# Altium schematic symbol library lib_datalogger.SchLib: 1246 symbols (part 9 of 16) (continued)
## CMP-011-000019-1 (continued)
HF INDUCTORS 33NH ±5% 300MA 0603 ROHS; Manufacturer Part Number: SDCL1608C33NJTDF; Source: mits.SchLib; Stock 1: 126950; Pricing 1: 50=0,02300, 500=0,01710, 1500=0,01610, 5000=0,01120, 25000=0,01090, 50000=0,01070, 50=0,02220, 500=0,01650, 1500=0,01550, 5000=0,01080, 25000=0,01050, 50000=0,01030, 50=0,11560, 500=0,08610, 1500=0,08080, 5000=0,05650, 25000=0,05450, 50000=0,05390, 50=0,11120, 500=0,08270, 1500=0,07770, 5000=0,05430, 25000=0,05240, 50000=0,05180, 50=0,01490, 500=0,01110, 1500=0,01040, 5000=0,00730, 25000=0,00700, 50000=0,00700, 50=0,01280, 500=0,00950, 1500=0,00890, 5000=0,00620, 25000=0,00600, 50000=0,00600, 50=0,13680, 500=0,10180, 1500=0,09560, 5000=0,06690, 25000=0,06450, 50000=0,06370, 50=1,93360, 500=1,43920, 1500=1,35130, 5000=0,94480, 25000=0,91190, 50000=0,90090, 50=0,07290, 500=0,05430, 1500=0,05100, 5000=0,03560, 25000=0,03440, 50000=0,03400, 50=1,33140, 500=0,99100, 1500=0,93050, 5000=0,65060, 25000=0,62790, 50000=0,62030, 50=0,15280, 500=0,11380, 1500=0,10680, 5000=0,07470, 25000=0,07210, 50000=0,07120, 50=0,02370, 500=0,01770, 1500=0,01660, 5000=0,01160, 25000=0,01120, 50000=0,01110, 50=0,01760, 500=0,01310, 1500=0,01230, 5000=0,00860, 25000=0,00830, 50000=0,00820 (AUD); Design Item ID: FIXED IND 33NH 300MA 800 MOHM 0603 SMD
footprint IND 6.6MM_7.1MM
footprint CI1608-0603 (Chip Inductor; Body 1.6 x 0.8 mm (LxW typ))
pins: 1, 2

## CMP-011-000020-1
designator L?, comment FIXED IND 470UH 50MA 22OHM 2518 SMD  Lead Pitch: 1.5mm  Shielding: Unshielded  Self Resonant Frequency: 3.5MHz  Packaging: Tape and Reel  Inductance: 470uH  Package Quantity: 2000  Core Material: Ferrite  Max Operating Temperature: 105°C  Current Rating: 50mA  Min Operating Temperature: -25°C  Manufacturer: Taiyo Yuden  Case/Package: 1007  RoHS Compliant: Yes  Tolerance: 10%
FIXED IND 470UH 50MA 22 OHM SMD; Manufacturer Part Number: LBC2518T471K; DC Resistance (DCR): 22R; Test Frequency: 796kHz; Height - Seated (Max): 0.079inch; Lead Free: Lead Free; ComponentLink1Description: https://datasheet.ciiva.com/8502/lbc2518t471k-ss-8502960.pdf?src-supplier=Avnet; DC Current: 50mA; Width: 0.071inch; Resistor Type: Wirewound; Pricing 1: 5=0,12170, 50=0,09320, 150=0,08810, 500=0,08290, 2500=0,08050, 5000=0,07940, 5=0,11660, 50=0,08930, 150=0,08440, 500=0,07940, 2500=0,07720, 5000=0,07600, 5=0,61140, 50=0,46820, 150=0,44260, 500=0,41630, 2500=0,40450, 5000=0,39860, 5=0,58640, 50=0,44910, 150=0,42450, 500=0,39930, 2500=0,38800, 5000=0,38230, 5=0,07880, 50=0,06040, 150=0,05710, 500=0,05370, 2500=0,05220, 5000=0,05140, 5=0,06700, 50=0,05130, 150=0,04850, 500=0,04560, 2500=0,04430, 5000=0,04370, 5=0,72390, 50=0,55440, 150=0,52410, 500=0,49300, 2500=0,47900, 5000=0,47200, 5=10,26330, 50=7,86000, 150=7,43010, 500=6,98920, 2500=6,79070, 5000=6,69150, 5=0,38510, 50=0,29490, 150=0,27880, 500=0,26220, 2500=0,25480, 5000=0,25110, 5=7,12640, 50=5,45770, 150=5,15920, 500=4,85300, 2500=4,71520, 5000=4,64630, 5=0,81080, 50=0,62090, 150=0,58700, 500=0,55210, 2500=0,53650, 5000=0,52860, 5=0,12490, 50=0,09560, 150=0,09040, 500=0,08500, 2500=0,08260, 5000=0,08140, 5=0,09310, 50=0,07130, 150=0,06740, 500=0,06340, 2500=0,06160, 5000=0,06070 (AUD); Case Code (Metric): 2518; Case Code (Imperial): 1007; Length: 0.098inch; Termination: SMD/SMT; ComponentLink3URL: https://datasheet.ciiva.com/26872/getdatasheetpartid-638686-26872344.pdf?src-supplier=Verical; ComponentLink2URL: https://datasheet.ciiva.com/1064/lbc2518t471k-ss-1064311.pdf?src-supplier=Digi-Key; Height: 2mm; Series: LB; Design Item ID: FIXED IND 470UH 50MA 22OHM 2518 SMD; Max DC Current: 50mA; Source: mits.SchLib; Category: Fixed Inductors; Radiation Hardening: No; Military Standard: Not; ComponentLink2Description: https://datasheet.ciiva.com/1064/lbc2518t471k-ss-1064311.pdf?src-supplier=Digi-Key; Mount: Surface Mount; Stock 1: 3920; Halogen Free: Halogen Free; RoHS: Yes; ComponentLink3Description: https://datasheet.ciiva.com/26872/getdatasheetpartid-638686-26872344.pdf?src-supplier=Verical; Depth: 2mm; ComponentLink1URL: https://datasheet.ciiva.com/8502/lbc2518t471k-ss-8502960.pdf?src-supplier=Avnet
footprint IND 6.6MM_7.1MM
footprint CI2518
pins: 1, 2

## CMP-011-000021-1
designator L?, comment FIXED IND 47UH 500MA 1.3 MOHM SMD  Inductance: 47uH  Tolerance: 10%  Manufacturer: Murata  Packaging: Tape and Reel  Shielding: Unshielded  Self Resonant Frequency: 15MHz  Core Material: Ferrite  Case/Package: 1210  Current Rating: 170mA  Min Operating Temperature: -40°C  Max Operating Temperature: 85°C  Package Quantity: 2000
FIXED IND 47UH 170MA 1.3 OHM SMD; Manufacturer Part Number: LQH32CN470K23L; Test Frequency: 1MHz; DC Resistance (DCR): 1.3R; Pricing 1: 1=0,33000, 10=0,29700, 100=0,20430, 500=0,17458, 1000=0,13372 (USD); Current: 170mA; Category: Fixed Inductors; ComponentLink2URL: https://datasheet.ciiva.com/5740/1784417-5740928.pdf?src-supplier=Farnell; Height: 2mm; Weight: 0.002116oz; Frequency: 15MHz; ComponentLink12URL: https://datasheet.ciiva.com/1042/l0075s0093lqh32c-2333-1042913.pdf?src-supplier=Digi-Key; ComponentLink7Description: https://datasheet.ciiva.com/1042/l0075s0093lqh32c-2333-1042915.pdf?src-supplier=Digi-Key; Radiation Hardening: No; Height - Seated (Max): 0.067inch; ComponentLink3Description: https://datasheet.ciiva.com/11799/0900766b8121da8f-11799965.pdf?src-supplier=RSComponents; ComponentLink10URL: https://datasheet.ciiva.com/8002/1784417-8002701.pdf?src-supplier=Element14; Lead Free: Lead Free; ComponentLink4Description: https://datasheet.ciiva.com/34302/1864636-34302895.pdf?src-supplier=Jameco; Depth: 2.7mm; Composition: Wirewound; Case Code (Metric): 3225; Width: 2.5mm; Military Standard: Not; Source: mits.SchLib; Inductance Tolerance: 10%; ComponentLink11URL: https://datasheet.ciiva.com/17247/l0075s0093lqh32c-2333-17247822.pdf?src-supplier=Avnet+Europe; ComponentLink6Description: https://datasheet.ciiva.com/1042/l0075s0093lqh32c-2333-1042914.pdf?src-supplier=Digi-Key; ComponentLink13URL: https://datasheet.ciiva.com/16456/l0075s0093lqh32c-2333-16456184.pdf?src-supplier=Future+Electronics; ComponentLink8Description: https://datasheet.ciiva.com/8506/l0075s0093lqh32c-2333-8506550.pdf?src-supplier=Avnet; Case Code (Imperial): 1210; ComponentLink4URL: https://datasheet.ciiva.com/34302/1864636-34302895.pdf?src-supplier=Jameco; Stock 1: 22937; ComponentLink8URL: https://datasheet.ciiva.com/8506/l0075s0093lqh32c-2333-8506550.pdf?src-supplier=Avnet; ComponentLink12Description: https://datasheet.ciiva.com/1042/l0075s0093lqh32c-2333-1042913.pdf?src-supplier=Digi-Key; ComponentLink1URL: https://datasheet.ciiva.com/18088/getdatasheetpartid-55803-18088831.pdf?src-supplier=Verical; ComponentLink7URL: https://datasheet.ciiva.com/1042/l0075s0093lqh32c-2333-1042915.pdf?src-supplier=Digi-Key; DC Current: 170mA; ComponentLink6URL: https://datasheet.ciiva.com/1042/l0075s0093lqh32c-2333-1042914.pdf?src-supplier=Digi-Key; Termination: SMD/SMT; ComponentLink1Description: https://datasheet.ciiva.com/18088/getdatasheetpartid-55803-18088831.pdf?src-supplier=Verical; ComponentLink11Description: https://datasheet.ciiva.com/17247/l0075s0093lqh32c-2333-17247822.pdf?src-supplier=Avnet+Europe; ComponentLink2Description: https://datasheet.ciiva.com/5740/1784417-5740928.pdf?src-supplier=Farnell; ComponentLink3URL: https://datasheet.ciiva.com/11799/0900766b8121da8f-11799965.pdf?src-supplier=RSComponents; ComponentLink10Description: https://datasheet.ciiva.com/8002/1784417-8002701.pdf?src-supplier=Element14; Mount: Surface Mount; ComponentLink13Description: https://datasheet.ciiva.com/16456/l0075s0093lqh32c-2333-16456184.pdf?src-supplier=Future+Electronics; REACH SVHC: No SVHC; ComponentLink5URL: https://datasheet.ciiva.com/29348/536643-da-01-en-induktivitaet-10-47uh-170ma-3-2x2-50-29348773.pdf?src-supplier=Conrad; Max DC Current: 170mA; ComponentLink9Description: https://datasheet.ciiva.com/8002/1784417-8002698.pdf?src-supplier=Element14; Design Item ID: FIXED IND 47UH 500MA 1.3 MOHM SMD; RoHS: Yes; ComponentLink9URL: https://datasheet.ciiva.com/8002/1784417-8002698.pdf?src-supplier=Element14; Length: 3.2mm; ComponentLink5Description: https://datasheet.ciiva.com/29348/536643-da-01-en-induktivitaet-10-47uh-170ma-3-2x2-50-29348773.pdf?src-supplier=Conrad
footprint IND 6.6MM_7.1MM
footprint CI3225
pins: 1, 2

## CMP-011-000022-1
designator L?, comment FIXED IND 5.6nH 800mA  51mOHM 0402 SMD  Case/Package: 0402  Inductance: 5.6nH  Package Quantity: 1  Core Material: Air  Max Operating Temperature: 125°C  RoHS Compliant: Yes  Manufacturer: Murata  Shielding: Unshielded  Current Rating: 800mA  Min Operating Temperature: -55°C  Q Factor: 30  Self Resonant Frequency: 8GHz  Packaging: Tape and Reel
FIXED IND 5.6NH 800MA 51 MOHM; Manufacturer Part Number: LQW15AN5N6C10D; DC Resistance (DCR): 51mR; Test Frequency: 100MHz; DC Current: 800mA; Category: Fixed Inductors; Case Code (Imperial): 0402; Max DC Current: 800mA; Weight: 2.8E-05oz; Length: 1mm; Depth: 0.7mm; REACH SVHC: No SVHC; ComponentLink4URL: https://datasheet.ciiva.com/17278/l0075s0080lqw15a-10-17278517.pdf?src-supplier=Avnet+Europe; Resistor Type: Wirewound; ComponentLink1URL: https://datasheet.ciiva.com/11799/0900766b8127613f-11799028.pdf?src-supplier=RSComponents; ComponentLink4Description: https://datasheet.ciiva.com/17278/l0075s0080lqw15a-10-17278517.pdf?src-supplier=Avnet+Europe; Height: 0.5mm; RoHS: Yes; ComponentLink2Description: https://datasheet.ciiva.com/6709/l0075s0080lqw15a-10-6709788.pdf?src-supplier=Digi-Key; Case Code (Metric): 1005; Number of Pins: 2; ComponentLink5URL: https://datasheet.ciiva.com/18089/getdatasheetpartid-103959-18089210.pdf?src-supplier=Verical; ComponentLink3Description: https://datasheet.ciiva.com/6709/l0075s0080lqw15a-10-6709791.pdf?src-supplier=Digi-Key; Width: 0.5mm; Lead Free: Lead Free; ComponentLink3URL: https://datasheet.ciiva.com/6709/l0075s0080lqw15a-10-6709791.pdf?src-supplier=Digi-Key; Radiation Hardening: No; ComponentLink5Description: https://datasheet.ciiva.com/18089/getdatasheetpartid-103959-18089210.pdf?src-supplier=Verical; Source: mits.SchLib; Military Standard: Not; Design Item ID: FIXED IND 5.6nH 800mA  51mOHM 0402 SMD; Pricing 1: 10=0,05460, 100=0,04020, 300=0,03760, 1000=0,03490, 5000=0,03380, 10000=0,03320, 10=0,05240, 100=0,03860, 300=0,03610, 1000=0,03360, 5000=0,03240, 10000=0,03190, 10=0,27310, 100=0,20110, 300=0,18800, 1000=0,17490, 5000=0,16900, 10000=0,16640, 10=0,26050, 100=0,19180, 300=0,17930, 1000=0,16680, 5000=0,16120, 10000=0,15870, 10=0,03500, 100=0,02580, 300=0,02410, 1000=0,02240, 5000=0,02170, 10000=0,02130, 10=0,03040, 100=0,02240, 300=0,02090, 1000=0,01940, 5000=0,01880, 10000=0,01850, 10=0,32430, 100=0,23880, 300=0,22320, 1000=0,20770, 5000=0,20070, 10000=0,19760, 10=4,55670, 100=3,35470, 300=3,13620, 1000=2,91760, 5000=2,81930, 10000=2,77560, 10=0,17250, 100=0,12700, 300=0,11870, 1000=0,11040, 5000=0,10670, 10000=0,10510, 10=3,20810, 100=2,36180, 300=2,20800, 1000=2,05410, 5000=1,98490, 10000=1,95410, 10=0,35640, 100=0,26240, 300=0,24530, 1000=0,22820, 5000=0,22050, 10000=0,21710, 10=0,05590, 100=0,04110, 300=0,03850, 1000=0,03580, 5000=0,03460, 10000=0,03400, 10=0,04170, 100=0,03070, 300=0,02870, 1000=0,02670, 5000=0,02580, 10000=0,02540 (AUD); ComponentLink2URL: https://datasheet.ciiva.com/6709/l0075s0080lqw15a-10-6709788.pdf?src-supplier=Digi-Key; Stock 1: 1580; Termination: SMD/SMT; ComponentLink1Description: https://datasheet.ciiva.com/11799/0900766b8127613f-11799028.pdf?src-supplier=RSComponents; Mount: Surface Mount
footprint IND 6.6MM_7.1MM
footprint CI1005-0402 (Chip Capacitor; Body 0.039" L x 0.020" W (1.00mm x 0.50mm))
pins: 1, 2

## CMP-011-000023-1
designator L?, comment FIXED IND 560UH 540MA 1.27 OHM TH  Shielding: Unshielded  Packaging: Bulk  Manufacturer: Abracon LLC  Tolerance: ±10%  Current Rating: 540mA  Inductance: 560µH
FIXED IND 560UH 540MA 1.27 OHM; Manufacturer Part Number: AIAP-02-561K; Type: Wirewound; Frequency - Test: 1kHz; DC Resistance (DCR): 1.27 Ohm Max; Design Item ID: FIXED IND 560UH 540MA 1.27 OHM TH; Operating Temperature: -40°C ~ 85°C; Package / Case: Axial; Q @ Freq: -; Pricing 1: 1=0.56, 10=0.49, 25=0.4552, 50=0.385, 100=0.35, 250=0.329, 500=0.294, 1000=0.238, 5000=0.217 (USD); Source: mits.SchLib; Stock 1: 3217; Frequency - Self Resonant: -; Category: Inductors, Coils, Chokes; Current - Saturation: -; Ratings: -; Supplier Device Package: Axial; Height - Seated (Max): -; Part Status: Active; Size / Dimension: 0.260" Dia x 0.550" L (6.40mm x 14.00mm); RoHS: RoHS Compliant; ComponentLink1URL: http://www.abracon.com/Magnetics/axial/AIAP-02.pdf; Mounting Type: Through Hole; Material - Core: -; ComponentLink1Description: http://www.abracon.com/Magnetics/axial/AIAP-02.pdf
footprint IND 6.6MM_7.1MM
footprint AXIAL_P18mm
pins: 1, 2

## CMP-011-000024-1
designator L?, comment FIXED IND 6.8uH 350MA 470 MOHM 0805 SMD_1  RoHS Compliant: Yes  Package Quantity: 2000  Case/Package: 0805  Current Rating: 400mA  Manufacturer: TDK  Core Material: Ferrite  Tolerance: 20%  Packaging: Tape and Reel  Inductance: 6.8uH  Shielding: Shielded  Saturation Current: 160mA  Min Operating Temperature: -55°C  Max Operating Temperature: 125°C
FIXED IND 6.8UH 400MA 520 MOHM; Manufacturer Part Number: MLZ2012M6R8WTD25; DC Resistance (DCR): 520mR; Test Frequency: 2MHz; Ratings: AEC-Q200; Category: Fixed Inductors; Weight: 0.000194oz; ComponentLink1Description: https://datasheet.ciiva.com/41833/inductor-automotive-decoupling-mlz-en-41833030.pdf?src-supplier=Digi-Key; RoHS: Yes; Max DC Current: 400mA; Termination: SMD/SMT; Pricing 1: 1=0,18000, 10=0,16100, 25=0,14320, 50=0,12160, 100=0,10720, 250=0,09832, 500=0,08938, 1000=0,07508 (USD); Stock 1: 340; Source: mits.SchLib; Height - Seated (Max): 0.057inch; Width: 0.049inch; Length: 0.079inch; Design Item ID: FIXED IND 6.8uH 350MA 470 MOHM 0805 SMD_1; Mount: Surface Mount; ComponentLink1URL: https://datasheet.ciiva.com/41833/inductor-automotive-decoupling-mlz-en-41833030.pdf?src-supplier=Digi-Key; Case Code (Imperial): 0805; Height: 1.25mm; Case Code (Metric): 2012
footprint IND 6.6MM_7.1MM
footprint CI2012-0805 (Chip Inductor)
pins: 1, 2

## CMP-011-000025-1
designator L?, comment IND FIXED 10uH 9A 20.7 MOHM SMD  Shielding: Shielded  Manufacturer: Wurth Electronics Inc  Tolerance: ±20%  Inductance: 10µH  Packaging: Cut Tape (CT)  Current Rating: 9A
FIXED IND 10UH 9A 20.7 MOHM SMD; Manufacturer Part Number: 7443331000; DC Resistance (DCR): 23.1 mOhm Max; Material - Core: Ferrite; Frequency - Test: 100kHz; Frequency - Self Resonant: 35MHz; Current - Saturation: 8A; Type: Wirewound; Size / Dimension: 0.429" L x 0.394" W (10.90mm x 10.00mm); Q @ Freq: -; Ratings: -; Category: Inductors, Coils, Chokes; Stock 1: 1063; RoHS: RoHS Compliant; Package / Case: Nonstandard; Operating Temperature: -40°C ~ 125°C; Pricing 1: 1=2.76, 10=2.628, 50=2.495, 100=2.406, 200=2.317 (USD); Height - Seated (Max): 0.382" (9.70mm); ComponentLink1URL: http://katalog.we-online.de/pbs/datasheet/7443331000.pdf; Mounting Type: Surface Mount; Design Item ID: IND FIXED 10uH 9A 20.7 MOHM SMD; Part Status: Active; ComponentLink1Description: http://katalog.we-online.de/pbs/datasheet/7443331000.pdf; Source: mits.SchLib
footprint IND 6.6MM_7.1MM
footprint INDUCTOR_10mmx10mm
pins: 1, 2

## CMP-011-000026-1
designator L?, comment IND FIXED 2.2uH 9.5A  15MOHM SMD  ComponentLink1URL: Sunlord-MWSA0603-2R2MT_C112126.pdf  Packaging: Cut Tape (CT)  Tolerance: ±20%  Inductance: 2.2µH  Current Rating: 9A
POWER INDUCTORS 2.2UH ±20% 9.5A SMD,6.6X7.1X3.0MM ROHS; Manufacturer Part Number 1: MWSA0603-2R2MT; Manufacturer 1: Sunlord; Type: Wirewound; Material - Core: Ferrite; RoHS: RoHS Compliant; Part Status: Active; Category: Inductors, Coils, Chokes; Supplier Unit Price 1: 0.2394; ComponentLink1Description: Sunlord-MWSA0603-2R2MT_C112126.pdf; Design Item ID: IND FIXED 2.2uH 9.5A  15MOHM SMD; Source: mits.SchLib; Operating Temperature: -40°C ~ 125°C; Mounting Type: Surface Mount
footprint IND 6.6MM_7.1MM
footprint IND 6.6MM_7.1MM (Precision Wire Wound Inductor, 2-Leads, Body 7,10x6,60mm, IPC Medium Density)
pins: 1, 2

## CMP-012-000000-1
designator IC?, comment PE42412
Integrated Circuit; Manufacturer_Name: Peregrine Semiconductor; Design Item ID: PE42412; Height: 0.9mm; Datasheet Link: http://www.psemi.com/pdf/datasheets/pe42412ds.pdf; Source: mits.SchLib; Manufacturer_Part_Number: PE42412
footprint QFN50P500X500X90-33N-D
footprint QFN50P500X500X90-33N-D
pins: 1 RF2, 2 GND_1, 3 RF3, 4 GND_2, 5 RF4, 6 GND_3, 7 RF5, 8 GND_4, 9 RF6, 10 GND_5, 11 VDD, 12 V1, 13 V2, 14 V3, 15 V4, 16 RF7, 17 GND_6, 18 RF8, 19 GND_7, 20 RF9, 21 GND_8, 22 RF10, 23 GND_9, 24 RF11, 25 GND_10, 26 RF12, 27 GND_11, 28 NC, 29 RFC, 30 GND_12, 31 RF1, 32 LS, 33 EP_GND

## CMP-00012-1
designator U?, comment IC TRANSCEIVER HALF 1/1 8DIP
Half-Duplex S-485 Transceiver 8-PDIP -40 to 85; Operating Supply Voltage: 5V; Max Supply Voltage: 5.5V; Nominal Supply Current: 2mA; Data Rate: 10Mbps; Simplex/Duplex: Half Duplex; Number of Receivers: 1; Min Supply Voltage: 4.5V; Packaging: Rail/Tube; Package Quantity: 50; Lead Free: Lead Free; RoHS Compliant: Yes; REACH SVHC: No SVHC; Supply Current: 2mA; Min Operating Temperature: -40°C; Number of Pins: 8; Logic Function: Transceiver; Mount: Through Hole; Radiation Hardening: No; Weight: 0.015521oz; Operating Supply Current: 2mA; Case/Package: P; Series: -; Number of Transceivers: 1; Max Operating Temperature: 85°C; Number of Drivers: 1; Number of Transmitters: 1
footprint P0008A-7 (DIP, 8-Leads, Body 10.15x6.6mm, Pitch 2.54mm)
pins: 1 R (hiz), 2 ~{RE} (in), 3 DE (in), 4 D (in), 5 GND (power), 6 A (io), 7 ~{B} (io), 8 VCC (power)

## CMP-012-000001-1
designator IC?, comment IC PE4259
Integrated Circuit; Manufacturer 1: Peregrine Semiconductor; Source: mits.SchLib; Manufacturer Part Number 1: PE4259; Height: 1.1mm; Datasheet Link: https://datasheet.datasheetarchive.com/originals/distributors/SFDatasheet-2/sf-00045491.pdf; Design Item ID: IC PE4259
footprint SOT65P210X110-6N (Footprint not found)
footprint SOT65P210X110-6N
pins: 1 RF1, 2 GND, 3 RF2, 4 CTRL, 5 RFC, 6 ~{CTRL_OR_VDD}

## CMP-012-000002-1
designator IC?, comment STM32WB55RGV6
MCU 32-Bit STM32WB55 ARM Cortex M4 RISC 1MB Flash 1.7V to 3.6V 68-Pin VFQFPN Tray; Manufacturer 1: STMicroelectronics; ComponentLink1Description: http://www.farnell.com/datasheets/2792352.pdf?src-supplier=Farnell; Source: mits.SchLib; Supplier Unit Price 2: 11.66; Height: 1mm; ComponentLink2URL: http://www.farnell.com/datasheets/2792352.pdf?src-supplier=Newark; Arrow Price/Stock: https://www.arrow.com/en/products/stm32wb55rgv6/stmicroelectronics; Arrow Part Number: STM32WB55RGV6; Stock 1: 4374; Datasheet Link: https://www.st.com/resource/en/datasheet/stm32wb55rg.pdf; RoHS: Yes; ComponentLink1URL: http://www.farnell.com/datasheets/2792352.pdf?src-supplier=Farnell; Design Item ID: STM32WB55RGV6; Pricing 1: 1=11,67000, 10=10,54000, 25=10,05000, 80=8,72638, 260=8,33423, 520=7,59885, 1040=7,14945 (USD); Manufacturer Part Number 1: STM32WB55RGV6; Mouser Part Number: 511-STM32WB55RGV6; Mouser Price/Stock: https://www.mouser.co.uk/ProductDetail/STMicroelectronics/STM32WB55RGV6?qs=lYGu3FyN48cg9Kq%252BQIugSQ%3D%3D; ComponentLink2Description: http://www.farnell.com/datasheets/2792352.pdf?src-supplier=Newark
footprint QFN40P800X800X100-69N-D
footprint QFN40P800X800X100-69N-D
pins: 1 VBAT, 2 PC13, 3 PC14-OSC32_IN, 4 PC15-OSC32_OUT, 5 PH3-BOOT0, 6 PB8, 7 PB9, 8 NRST, 9 PC0, 10 PC1, 11 PC2, 12 PC3, 13 VREF+, 14 VDDA, 15 PA0, 16 PA1, 17 PA2, 18 PA3, 19 PA4, 20 PA5, 21 PA6, 22 PA7, 23 PA8, 24 PA9, 25 PC4, 26 PC5, 27 PB2, 28 PB10, 29 PB11, 30 VDD_1, 31 RF1, 32 VSSRF, 33 VDDRF, 34 OSC_OUT, 35 OSC_IN, 36 AT0, 37 AT1, 38 PB0, 39 PB1, 40 PE4, 41 VFBSMPS, 42 VSSSMPS, 43 VLXSMPS, 44 VDDSMPS, 45 VDD_2, 46 PB12, 47 PB13, 48 PB14, 49 PB15, 50 PC6, 51 PA10, 52 PA11, 53 PA12, 54 PA13, 55 VDDUSB, 56 PA14, 57 PA15, 58 PC10, 59 PC11, 60 PC12, 61 PD0, 62 PD1, 63 PB3, 64 PB4, 65 PB5, 66 PB6, 67 PB7, 68 VDD_3, 69 EP_(GND)

## CMP-012-000003-1
designator IC?, comment IC STM32WB55RGV6
Integrated Circuit; Manufacturer_Name: STMicroelectronics; Source: mits.SchLib; Mouser Part Number: 511-STM32WB55RGV6; Mouser Price/Stock: https://www.mouser.co.uk/ProductDetail/STMicroelectronics/STM32WB55RGV6?qs=lYGu3FyN48cg9Kq%252BQIugSQ%3D%3D; Arrow Price/Stock: https://www.arrow.com/en/products/stm32wb55rgv6/stmicroelectronics; Manufacturer_Part_Number: STM32WB55RGV6; Arrow Part Number: STM32WB55RGV6; Datasheet Link: https://www.st.com/resource/en/datasheet/stm32wb55rg.pdf; Height: 1mm; Design Item ID: IC STM32WB55RGV6
footprint QFN40P800X800X100-69N-D
footprint QFN40P800X800X100-69N-D
pins: 1 VBAT, 2 PC13, 3 PC14-OSC32_IN, 4 PC15-OSC32_OUT, 5 PH3-BOOT0, 6 PB8, 7 PB9, 8 NRST, 9 PC0, 10 PC1, 11 PC2, 12 PC3, 13 VREF+, 14 VDDA, 15 PA0, 16 PA1, 17 PA2, 18 PA3, 19 PA4, 20 PA5, 21 PA6, 22 PA7, 23 PA8, 24 PA9, 25 PC4, 26 PC5, 27 PB2, 28 PB10, 29 PB11, 30 VDD_1, 31 RF1, 32 VSSRF, 33 VDDRF, 34 OSC_OUT, 35 OSC_IN, 36 AT0, 37 AT1, 38 PB0, 39 PB1, 40 PE4, 41 VFBSMPS, 42 VSSSMPS, 43 VLXSMPS, 44 VDDSMPS, 45 VDD_2, 46 PB12, 47 PB13, 48 PB14, 49 PB15, 50 PC6, 51 PA10, 52 PA11, 53 PA12, 54 PA13, 55 VDDUSB, 56 PA14, 57 PA15, 58 PC10, 59 PC11, 60 PC12, 61 PD0, 62 PD1, 63 PB3, 64 PB4, 65 PB5, 66 PB6, 67 PB7, 68 VDD_3, 69 EP_(GND)

## CMP-012-000005-1
designator U?, comment IC  MCP4802 Dual 8-Bit Voltage Output DAC
Manufacturer: Microchip Technology; Manufacturer Part Number: MCP3208-CI/SL; Part#: MCP9808T-E/MC; Number of DAC Channels: 2; Nominal Supply Current: 320uA; Settling Time: 4.5us; Sampling Rate: 100KS/s; Differential Nonlinearity: 1LSB; Min Supply Voltage: 2.7V; Number of A/D Converters: 1; Integral Nonlinearity (INL): 2LSB; eVendorPrice: 1,13; Interface: SPI,Serial; Number of Bits: 12; Number of Channels: 8; eVendor#: MCP9808T-E/MCCT-ND; Max Supply Voltage: 5.5V; Operating Supply Voltage: 5V; MSRP: 0,85; Supply Type: Single; Resolution: 12b; Signal to Noise Ratio (SNR): 100dB; eVendor: Digi-Key; Reference Voltage: 2.048V; Full Scale Error: 5LSB; Polarity: Unipolar; Output Voltage: 4.1V; Input Offset Voltage (Vos): 820uV; ComponentLink18Description: https://datasheet.ciiva.com/7660/630374-7660748.pdf?src-supplier=Element14; ComponentLink2URL: https://datasheet.ciiva.com/18411/70045411-18411669.pdf?src-supplier=Allied+Electronics; ComponentLink5URL: https://datasheet.ciiva.com/16389/filehandler-aspxddocname-en011591-16389094.pdf?src-supplier=Future+Electronics; ComponentLink8URL: https://datasheet.ciiva.com/26922/getdatasheetpartid-768581-26922587.pdf?src-supplier=Verical; ComponentLink15Description: https://datasheet.ciiva.com/1367/22249a-1367573.pdf?src-supplier=Digi-Key; Stock 3: 967; ComponentLink13URL: https://datasheet.ciiva.com/26922/getdatasheetpartid-757933-26922589.pdf?src-supplier=Verical; ComponentLink16URL: https://datasheet.ciiva.com/8169/22249a-8169255.pdf?src-supplier=Avnet; Package Quantity: 50; Mount: Surface Mount; ComponentLink4Description: https://datasheet.ciiva.com/8065/808967-8065814.pdf?src-supplier=Element14; Packaging: Rail/Tube; ComponentLink18URL: https://datasheet.ciiva.com/7660/630374-7660748.pdf?src-supplier=Element14; ComponentLink6URL: https://datasheet.ciiva.com/16608/21298e-16608950.pdf?src-supplier=Avnet+Europe; ComponentLink9Description: https://datasheet.ciiva.com/41459/001083265-da-01-en-dac-8b-spi-vref-mcp4802-e-ms-msop-8-mcp-41459026.pdf?src-supplier=Conrad; ComponentLink8Description: https://datasheet.ciiva.com/26922/getdatasheetpartid-768581-26922587.pdf?src-supplier=Verical; Source: mits.SchLib; ComponentLink1URL: https://datasheet.ciiva.com/1256/21298e-1256787.pdf?src-supplier=Digi-Key; Output Type: Voltage; Pricing 3: 1=1,48000, 25=1,23000, 100=1,12000 (USD); ComponentLink7URL: https://datasheet.ciiva.com/14118/aqmicrochip-a-d-wandler-mcp3204-en-14118170.pdf?src-supplier=Distrelec; Design Item ID: IC  MCP4802 Dual 8-Bit Voltage Output DAC; ComponentLink2Description: https://datasheet.ciiva.com/18411/70045411-18411669.pdf?src-supplier=Allied+Electronics; Height: 1.25mm; ComponentLink7Description: https://datasheet.ciiva.com/14118/aqmicrochip-a-d-wandler-mcp3204-en-14118170.pdf?src-supplier=Distrelec; REACH SVHC: No SVHC; Radiation Hardening: No; RoHS: Yes; ComponentLink3Description: https://datasheet.ciiva.com/3038/21298e-3038054.pdf?src-supplier=Avnet; Length: 9.9mm; ComponentLink5Description: https://datasheet.ciiva.com/16389/filehandler-aspxddocname-en011591-16389094.pdf?src-supplier=Future+Electronics; ComponentLink11Description: https://datasheet.ciiva.com/3041/22249a-3041493.pdf?src-supplier=Avnet; Number of Converters: 1; ComponentLink9URL: https://datasheet.ciiva.com/41459/001083265-da-01-en-dac-8b-spi-vref-mcp4802-e-ms-msop-8-mcp-41459026.pdf?src-supplier=Conrad; Conversion Rate: 100KS/s; Number of Elements: 1; ComponentLink15URL: https://datasheet.ciiva.com/1367/22249a-1367573.pdf?src-supplier=Digi-Key; ComponentLink10URL: https://datasheet.ciiva.com/1367/22249a-1367572.pdf?src-supplier=Digi-Key; ComponentLink16Description: https://datasheet.ciiva.com/8169/22249a-8169255.pdf?src-supplier=Avnet; Pricing 1: 1=1,48000, 25=1,23000, 100=1,12000 (USD); Case/Package: SOIC; ComponentLink4URL: https://datasheet.ciiva.com/8065/808967-8065814.pdf?src-supplier=Element14; ComponentLink10Description: https://datasheet.ciiva.com/1367/22249a-1367572.pdf?src-supplier=Digi-Key; Datasheet: http://www.microchip.com/mymicrochip/filehandler.aspx?ddocname=en556196; ComponentLink19Description: https://datasheet.ciiva.com/16346/filehandler-aspxddocname-en547855-16346716.pdf?src-supplier=Future+Electronics; Max Operating Temperature: 85°C; ComponentLink17Description: https://datasheet.ciiva.com/16625/22249a-16625657.pdf?src-supplier=Avnet+Europe; ComponentLink14URL: https://datasheet.ciiva.com/41459/001083267-da-01-en-dac-8b-spi-vref-mcp4802-e-sn-soic-8-mcp-41459024.pdf?src-supplier=Conrad; ComponentLink14Description: https://datasheet.ciiva.com/41459/001083267-da-01-en-dac-8b-spi-vref-mcp4802-e-sn-soic-8-mcp-41459024.pdf?src-supplier=Conrad; Min Operating Temperature: -40°C; ComponentLink13Description: https://datasheet.ciiva.com/26922/getdatasheetpartid-757933-26922589.pdf?src-supplier=Verical; ComponentLink12Description: https://datasheet.ciiva.com/16454/filehandler-aspxddocname-en547855-16454079.pdf?src-supplier=Future+Electronics; Number of Pins: 16; ComponentLink3URL: https://datasheet.ciiva.com/3038/21298e-3038054.pdf?src-supplier=Avnet; Category: Analog to Digital Converters (ADCs); ComponentLink11URL: https://datasheet.ciiva.com/3041/22249a-3041493.pdf?src-supplier=Avnet; Contact Plating: Tin,Matte; MOQ: 100; ComponentLink17URL: https://datasheet.ciiva.com/16625/22249a-16625657.pdf?src-supplier=Avnet+Europe; Obs: --; ComponentLink12URL: https://datasheet.ciiva.com/16454/filehandler-aspxddocname-en547855-16454079.pdf?src-supplier=Future+Electronics; ComponentLink19URL: https://datasheet.ciiva.com/16346/filehandler-aspxddocname-en547855-16346716.pdf?src-supplier=Future+Electronics; ComponentLink6Description: https://datasheet.ciiva.com/16608/21298e-16608950.pdf?src-supplier=Avnet+Europe; Stock 1: 404; Lead Free: Lead Free; ComponentLink1Description: https://datasheet.ciiva.com/1256/21298e-1256787.pdf?src-supplier=Digi-Key; Width: 3.9mm; Number of Inputs: 8; Pricing 2: 300=1,15900, 500=1,14950, 800=1,14000, 1500=1,13050, 3000=1,12100 (USD)
footprint SOIC-8
footprint SOIC-8
pins: 1 VDD (power), 2 CS (in), 3 SCK (in), 4 SDI (in), 5 LDCA (in), 6 V_OUTB (out), 7 VSS (power), 8 V_OUTA (out)

## CMP-012-00005-3
designator T?, comment 760390014
Audio & Signal Transformer, 475 uH, -40 to 125 degC, 6-Pin SMD, RoHS, Tape and Reel; Manufacturer: Wuerth Elektronik; Inductance: 475uH; Mounting Technology: SurfaceMount; Datasheet URL: https://datasheet.ciiva.com/12335/760390014-221199-12335395.pdf; Package Reference: 760390014; Package Description: 6-Pin Surface Mounted Device, Body 7.14 x 6.73 mm, Pitch 2.54 mm; Min Operating Temperature: -40°C; RoHS Compliant: True; Max Operating Temperature: 125°C; Pins: 6; Case/Package: SMD; Datasheet Version: Rev. 6C, 06/2013
footprint WE-760390014-6_V (SMD, 6-Leads, Body 7.14x6.73mm, Pitch 2.54mm)
pins: 1, 2, 3, 4, 5, 6

## CMP-012-000006-1
designator U?, comment IC 24LC256 EEPROM 256KBIT 400KHZ 8TSSOP
IC EEPROM 256KBIT 400KHZ 8TSSOP; Manufacturer Part Number: 24LC256T-I/ST; Manufacturer: Microchip Technology; Memory Size: 256Kb (32K x 8); Interface: I²C, 2-Wire Serial; Memory Type: Non-Volatile; Voltage - Supply: 2.5 V ~ 5.5 V; Memory Format: EEPROM; Part Status: Active; Speed: 400kHz; Operating Temperature: -40°C ~ 85°C (TA); Category: Integrated Circuits (ICs); Stock 1: 2831; Package / Case: 8-TSSOP (0.173", 4.40mm Width); Pricing 1: 1=0.85 (USD); Supplier Device Package: 8-TSSOP; Packaging: Cut Tape (CT); Source: mits.SchLib; RoHS: RoHS Compliant; ComponentLink1URL: http://www.microchip.com/mymicrochip/filehandler.aspx?ddocname=en011849; ComponentLink1Description: http://www.microchip.com/mymicrochip/filehandler.aspx?ddocname=en011849; Design Item ID: IC 24LC256 EEPROM 256KBIT 400KHZ 8TSSOP
footprint 8-DFN
footprint TSSOP8-8
pins: 1 A0 "DEVICE ADDRES 0", 2 A1 "DEVICE ADDRES 1", 3 A2 "DEVICE ADDRES 2", 4 GND "GROUND", 5 SDA "I2C DATA", 6 SCL "I2C DATA CLOCK", 7 WP "WRITE PROTECTION", 8 VCC "3.3V VOLTAGE SUPLY"

## CMP-012-00006-3
designator T?, comment ALT3232M-151-T001
Pulse Transformer for LAN Interface, 2.5 dB, -40 to 85 degC, 6-Pin SMD, RoHS, Tape and Reel; Manufacturer: TDK; Inductance: 150uH; Insertion Loss: 2.5dB; Datasheet URL: https://product.tdk.com/info/en/catalog/datasheets/trans_alt_en.pdf; Package Reference: ALT3232; RoHS Compliant: True; Min Operating Temperature: -40°C; Case/Package: SMD; Package Description: 6-Pin Surface Mount Device, Body 3.2 x 3.2 mm; Max Operating Temperature: 80°C; Datasheet Version: May-16; Pins: 6; Mounting Technology: SurfaceMount
footprint TDK-ALT3232_V (SMD, 6-Leads, Body 3.2x3.2mm)
pins: 1, 2, 3, 4, 5, 6

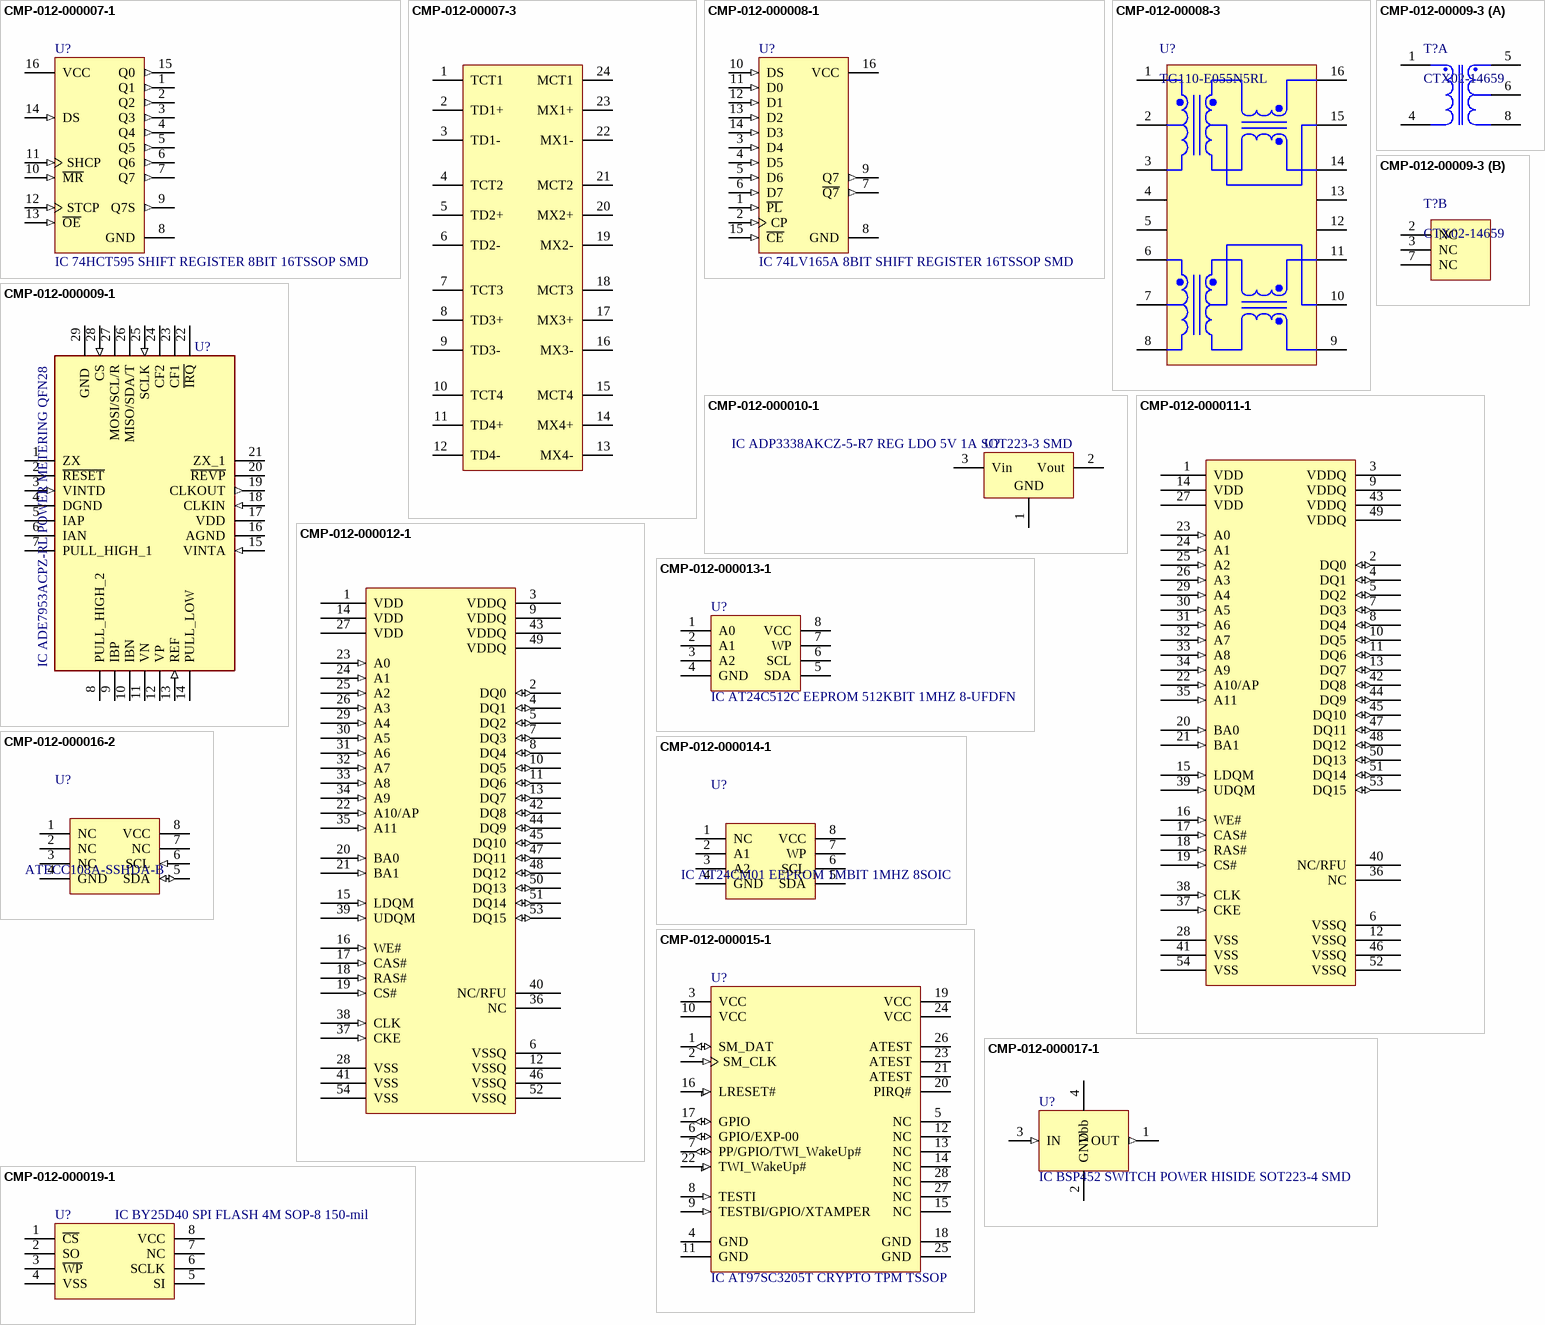
[diagram p24: symbols CMP-012-000007-1 to CMP-012-000019-1]

## CMP-012-000007-1
designator U?, comment IC 74HCT595 SHIFT REGISTER 8BIT 16TSSOP SMD
IC SHIFT REGISTER 8BIT 16TSSOP; Manufacturer Part Number: 74HCT595PW,118; Manufacturer: Nexperia USA Inc.; Function: Serial to Parallel, Serial; Number of Bits per Element: 8; Voltage - Supply: 4.5 V ~ 5.5 V; Output Type: Tri-State; Supplier Device Package: 16-TSSOP; Source: mits.SchLib; Category: Integrated Circuits (ICs); ComponentLink1Description: http://assets.nexperia.com/documents/data-sheet/74HC_HCT595.pdf; ComponentLink1URL: http://assets.nexperia.com/documents/data-sheet/74HC_HCT595.pdf; Design Item ID: IC 74HCT595 SHIFT REGISTER 8BIT 16TSSOP SMD; Mounting Type: Surface Mount; RoHS: RoHS Compliant; Operating Temperature: -40°C ~ 125°C; Logic Type: Shift Register; Stock 1: 41558; Packaging: Cut Tape (CT); Pricing 1: 1=0.89, 10=0.8, 100=0.6235, 500=0.5151, 1000=0.40665 (USD); Package / Case: 16-TSSOP (0.173", 4.40mm Width); Part Status: Active
footprint 16-TSSOP
footprint 16-TSSOP
pins: 1 Q1 (out) "parallel data output", 2 Q2 (out) "parallel data output", 3 Q3 (out) "parallel data output", 4 Q4 (out) "parallel data output", 5 Q5 (out) "parallel data output", 6 Q6 (out) "parallel data output", 7 Q7 (out) "parallel data output", 8 GND (power) "ground (0 V)", 9 Q7S (out) "serial data output", 10 ~{MR} (in) "master reset (active LOW)", 11 SHCP (in) "shift register clock input", 12 STCP (in) "storage register clock input", 13 ~{OE} (in) "output enable input (active LOW)", 14 DS (in) "serial data input", 15 Q0 (out) "parallel data output", 16 VCC (power) "positive supply voltage"

## CMP-012-00007-3
designator U?, comment HX5008NL
Telecom Transformer 1:1 24Term, 0 to 70 degC, 24-Pin SMD, RoHS, Rail/Tube; Manufacturer: Pulse Electronics; SymbolCreator: Altium; Insertion Loss: 1dB; Return Loss: -10dB; SymbolVersion: 2014-09-23; Max Operating Temperature: 80°C; Package Description: 24-Pin Surface Mount Device, Body 15.11 x 13.16 mm, Pitch 0.99 mm; Datasheet URL: http://www.mouser.com/ds/2/336/-515483.pdf; Mounting Technology: SurfaceMount; Min Operating Temperature: -40°C; Package Reference: HX5008NL; Datasheet Version: Rev. A, 07/2015; Case/Package: SOP; Pins: 24; RoHS Compliant: True
footprint PULS-HX5008NL_V (SOP, 24-Leads, Body 15.1x13.2mm, Pitch 0.99mm)
pins: 1 TCT1, 2 TD1+, 3 TD1-, 4 TCT2, 5 TD2+, 6 TD2-, 7 TCT3, 8 TD3+, 9 TD3-, 10 TCT4, 11 TD4+, 12 TD4-, 13 MX4-, 14 MX4+, 15 MCT4, 16 MX3-, 17 MX3+, 18 MCT3, 19 MX2-, 20 MX2+, 21 MCT2, 22 MX1-, 23 MX1+, 24 MCT1

## CMP-012-000008-1
designator U?, comment IC 74LV165A 8BIT SHIFT REGISTER 16TSSOP SMD
IC 8BIT SHIFT REGISTER 16TSSOP; Manufacturer Part Number: 74LV165APW,118; Manufacturer: Nexperia USA Inc.; Number of Bits per Element: 8; Output Type: Complementary; Voltage - Supply: 2 V ~ 5.5 V; Function: Parallel or Serial to Serial; Supplier Device Package: 16-TSSOP; Source: mits.SchLib; ComponentLink1URL: http://assets.nexperia.com/documents/data-sheet/74LV165A.pdf; Design Item ID: IC 74LV165A 8BIT SHIFT REGISTER 16TSSOP SMD; RoHS: RoHS Compliant; Packaging: Cut Tape (CT); Category: Integrated Circuits (ICs); Stock 1: 1059; Logic Type: Shift Register; ComponentLink1Description: http://assets.nexperia.com/documents/data-sheet/74LV165A.pdf; Operating Temperature: -40°C ~ 85°C; Mounting Type: Surface Mount; Pricing 1: 1=0.41, 10=0.35, 100=0.261, 500=0.20508, 1000=0.15847 (USD); Part Status: Active; Package / Case: 16-TSSOP (0.173", 4.40mm Width)
footprint 16-TSSOP
footprint 16-TSSOP
pins: 1 ~{PL} (in) "parallel enable input (active LOW)", 2 CP (in) "clock input (LOW-to-HIGH edge-triggered)", 3 D4 (in) "parallel data input", 4 D5 (in) "parallel data input", 5 D6 (in) "parallel data input", 6 D7 (in) "parallel data input", 7 ~{Q7} (out) "complementary serial output from the last stage", 8 GND (power) "ground (0 V)", 9 Q7 (out) "serial output from the last stage", 10 DS (in) "serial data input", 11 D0 (in) "parallel data input", 12 D1 (in) "parallel data input", 13 D2 (in) "parallel data input", 14 D3 (in) "parallel data input", 15 ~{CE} (in) "clock enable input (active LOW)", 16 VCC (power) "positive supply voltage"

## CMP-012-00008-3
designator U?, comment TG110-E055N5RL
Single Port 10/100BASE-TX Transformer, -40 to 85 degC, 16-Pin SMD (N5), RoHS; Manufacturer: HALO Electronics; Inductance: 0.4uH; DCR: 1Ohm; Case/Package: Module; Mounting Technology: SurfaceMount; Package Reference: N5-16; Datasheet URL: http://download.siliconexpert.com/pdfs/2015/10/26/2/23/53/15/halo_/manual/1904914511853938ultra.pdf; Package Description: 16-Pin Surface Mount Device, Body 12.7 x 7.11 mm, Pitch 1.27 mm; Datasheet Version: Aug-15; Min Operating Temperature: -40°C; Pins: 16; RoHS Compliant: True; Max Operating Temperature: 80°C
footprint HLE-N5-16_V (SMD, 16-Leads, Body 12.7x7.11mm, Pitch 1.27mm)
pins: 1, 2, 3, 4, 5, 6, 7, 8, 9, 10, 11, 12, 13, 14, 15, 16

## CMP-012-000009-1
designator U?, comment IC ADE7953ACPZ-RL POWER METERING QFN28
Multifunction Metering IC 28-Pin LFCSP EP T/R; Manufacturer_Name: Analog Devices; Nominal Supply Current: 6.8mA; Input Impedance: 660kR; Arrow Part Number: ADE7953ACPZ-RL; Min Operating Temperature: -40°C; Series: -; Source: mits.SchLib; Design Item ID: IC ADE7953ACPZ-RL POWER METERING QFN28; Manufacturer_Part_Number: ADE7953ACPZ-RL; Packaging: Tape and Reel; Max Operating Temperature: 85°C; ComponentLink1Description: https://datasheet.ciiva.com/46633/ade7953-46633503.pdf?src-supplier=Digi-Key; Mount: Surface Mount; ComponentLink1URL: https://datasheet.ciiva.com/46633/ade7953-46633503.pdf?src-supplier=Digi-Key; Pricing 1: 1=2,88000, 10=2,15820, 30=2,02630, 100=1,89420, 500=1,83520, 1000=1,80690, 1=2,77230, 10=2,07750, 30=1,95050, 100=1,82330, 500=1,76650, 1000=1,73930, 1=14,46650, 10=10,84100, 30=10,17810, 100=9,51450, 500=9,21810, 1000=9,07620, 1=13,90680, 10=10,42160, 30=9,78430, 100=9,14630, 500=8,86150, 1000=8,72510, 1=1,87010, 10=1,40140, 30=1,31570, 100=1,22990, 500=1,19160, 1000=1,17330, 1=1,59860, 10=1,19800, 30=1,12470, 100=1,05140, 500=1,01860, 1000=1,00300, 1=17,11590, 10=12,82640, 30=12,04210, 100=11,25700, 500=10,90640, 1000=10,73850, 1=241,90180, 10=181,27810, 30=170,19260, 100=159,09620, 500=154,14130, 1000=151,76820, 1=9,12420, 10=6,83750, 30=6,41940, 100=6,00090, 500=5,81400, 1000=5,72450, 1=166,56720, 10=124,82330, 30=117,19020, 100=109,54950, 500=106,13760, 1000=104,50360, 1=19,12180, 10=14,32960, 30=13,45330, 100=12,57620, 500=12,18450, 1000=11,99690, 1=2,96820, 10=2,22440, 30=2,08830, 100=1,95220, 500=1,89140, 1000=1,86230, 1=2,20180, 10=1,65000, 30=1,54910, 100=1,44810, 500=1,40300, 1000=1,38140 (AUD); Mouser Price/Stock: https://www.mouser.co.uk/ProductDetail/Analog-Devices/ADE7953ACPZ-RL?qs=BpaRKvA4VqEEtm%2FBpTzUmQ%3D%3D; Number of Pins: 28; RoHS Compliant: Yes; Operating Supply Current: 6.8mA; Case/Package: LFCSP EP; Package Quantity: 5000; Stock 1: 1135; Arrow Price/Stock: https://www.arrow.com/en/products/ade7953acpz-rl/analog-devices; Datasheet Link: http://www.mouser.com/ds/2/609/ADE7953-878394.pdf; Category: Analog to Digital Converters (ADCs); RoHS: Yes; Manufacturer: Analog Devices; Manufacturer Part Number: ADE7953ACPZ-RL; Mouser Part Number: 584-ADE7953ACPZ-R; Lead Free: Contains Lead; Radiation Hardening: No; Height: 0.8mm
footprint QFN50P500X500X80_HS-29N (QFN, 28-Leads, Body 5,00x5,00mm, Pitch 0,50mm, Thermal Pad 3,14x3,14mm, IPC Medium Density)
footprint QFN50P500X500X80_HS-29N (QFN, 28-Leads, Body 5,00x5,00mm, Pitch 0,50mm, Thermal Pad 3,14x3,14mm, IPC Medium Density)
pins: 1 ZX, 2 ~{RESET}, 3 VINTD (in), 4 DGND (power), 5 IAP, 6 IAN, 7 PULL_HIGH_1, 8 PULL_HIGH_2, 9 IBP, 10 IBN, 11 VN, 12 VP, 13 REF (in), 14 PULL_LOW, 15 VINTA (in), 16 AGND (power), 17 VDD (power), 18 CLKIN (in), 19 CLKOUT (out), 20 ~{REVP}, 21 ZX_1, 22 ~{IRQ}, 23 CF1, 24 CF2, 25 SCLK (in), 26 MISO/SDA/T, 27 MOSI/SCL/R, 28 CS (in), 29 GND  (power)

## CMP-012-00009-3
designator T?, comment CTX02-14659
Transformer Push-Pull, 547 uH, ER 9.5, 8-Pin SMT, RoHS, Tape and Reel; Manufacturer: EATON; RoHS Compliant: True; Package Description: 8-Pin Surface Mount Technology, Body 10 x 8.1 mm, Pitch 2 mm; Case/Package: SMD; Pins: 8; Datasheet URL: https://datasheet.ciiva.com/36178/1771317-36178918.pdf; Datasheet Version: Rev. H, 09/2006; Mounting Technology: SurfaceMount; Package Reference: CTX02-14659
footprint EATN-CTX02-14659_V (SMT, 8-Leads, Body 10x8.1mm, Pitch 2mm)
part A pins: 1, 4, 5, 6, 8
part B pins: 2 NC, 3 NC, 7 NC
